# Altium footprint library PcbLib.PcbLib: 141 footprints (part 1 of 9)
Each footprint in its own frame and in the unit in brackets; x right, y up, seen from the top. Pads: shape width x height; smd on the part's side, far side on the other; paste and mask are expansions set on the pad; w line width, h text height; cw(c..) or ccw(c..) is an arc to the next point about the centre after c.
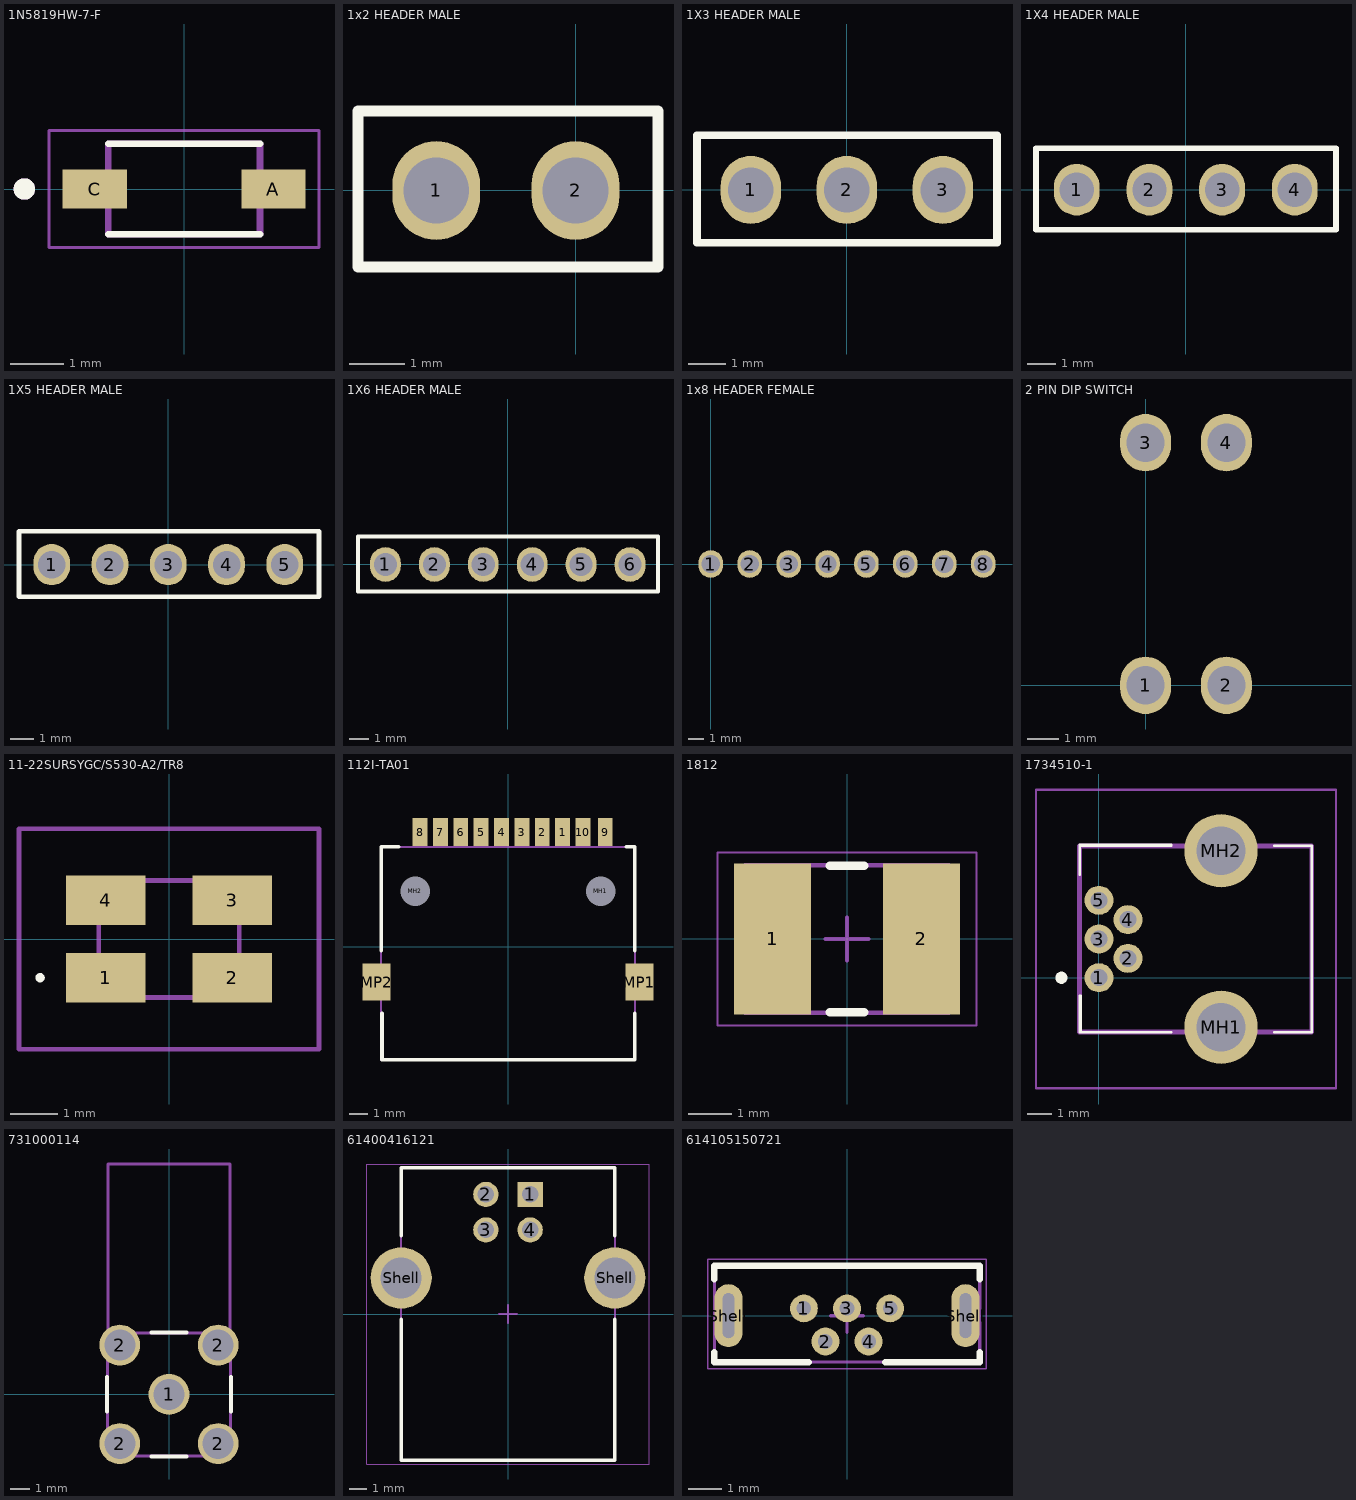
[diagram p0: the footprints below, top view; thin cyan lines are the x and y axes]

## 1N5819HW-7-F [mm]
pads (2):
  rect 1.21x0.73 smd: A(1.68,0) C(-1.68,0)
Top Overlay:
  circle w0.2: c-3,0 r0.1
  lines w0.127: -1.425,-0.85 1.425,-0.85 ; -1.425,0.85 1.425,0.85
Mechanical 13:
  circle w0.2: c-3,0 r0.1
  lines w0.127: -1.425,-0.85 1.425,-0.85 1.425,0.85 -1.425,0.85 -1.425,-0.85
Mechanical 15:
  lines w0.05: -2.535,-1.1 2.535,-1.1 2.535,1.1 -2.535,1.1 -2.535,-1.1
3D body "step_temp.STEP": height 1.5, standoff -0.03, extent -1.825,-0.775 1.825,0.775

## 1x2 HEADER MALE [mm]
pads (2):
  oval 1.6x1.8 hole 1.2: 1(-2.54,0) 2(0,0)
Top Overlay:
  lines w0.2: -3.965,-1.4 1.5,-1.4 1.5,1.45 -3.965,1.45 -3.965,-1.4
3D body "1x2THPitch 2_54mm.stp": height 9.2, standoff -3.5, extent -3.76,-1.27 1.32,1.27

## 1X3 HEADER MALE [mm]
pads (3):
  oval 1.6x1.8 hole 1.2: 1(-2.54,0) 2(0,0) 3(2.54,0)
Top Overlay:
  lines w0.2: -3.965,-1.4 -3.965,1.45 3.97,1.45 3.97,-1.4 -3.965,-1.4
3D body "1x3THPitch 2_54mm.STEP": height 9.2, standoff -3.5, extent -3.81,-1.27 3.81,1.27

## 1X4 HEADER MALE [mm]
pads (4):
  oval 1.6x1.8 hole 1.2: 1(-3.81,0) 2(-1.27,0) 3(1.27,0) 4(3.81,0)
Top Overlay:
  lines w0.2: -5.235,-1.4 -5.235,1.45 5.25,1.45 5.25,-1.4 -5.235,-1.4
3D body "1x4THPitch 2_54mm.STEP": height 9.2, standoff -3.5, extent -5.08,-1.27 5.08,1.27

## 1X5 HEADER MALE [mm]
pads (5):
  oval 1.6x1.8 hole 1.2: 1(-5.08,0) 2(-2.54,0) 3(0,0) 4(2.54,0) 5(5.08,0)
Top Overlay:
  lines w0.2: -6.505,-1.4 6.57,-1.4 6.57,1.45 -6.505,1.45 -6.505,-1.4
3D body "1x5THPitch 2_54mm.stp": height 9.2, standoff -3.5, extent -6.32,-1.27 6.38,1.27

## 1X6 HEADER MALE [mm]
pads (6):
  oval 1.6x1.8 hole 1.2: 1(-6.35,0) 2(-3.81,0) 3(-1.27,0) 4(1.27,0) 5(3.81,0) 6(6.35,0)
Top Overlay:
  lines w0.2: -7.775,-1.4 7.8,-1.4 7.8,1.45 -7.775,1.45 -7.775,-1.4
3D body "1x6THPitch 2_54mm.STEP": height 9.2, standoff -3.5, extent -7.62,-1.27 7.62,1.27

## 1x8 HEADER FEMALE [mm]
pads (8):
  oval 1.6x1.8 hole 1.2: 1(0,0) 2(2.54,0) 3(5.08,0) 4(7.62,0) 5(10.16,0) 6(12.7,0) 7(15.24,0) 8(17.78,0)
3D body "1X8Female.step": height 8.5, standoff -3.2, extent -1.46,-1.27 19.36,1.27

## 2 PIN DIP SWITCH [mm]
pads (4):
  oval 1.6x1.8 hole 1.2: 1(0,0) 2(2.54,0) 3(0,7.62) 4(2.54,7.62)
3D body "DIP Red 2-way.step": height 6.7, standoff -2, extent -1.92,-1.15 4.52,8.75

## 2S 18650 Battery Pack [mm]
3D body "2S 18650 Battery.stp": height 19.54, standoff 0, extent -37.9,-20.8 38.1,20.2

## 11-22SURSYGC/S530-A2/TR8 [mm]
pads (4):
  rect 1.7x1.05 smd: 1(-1.35,-0.825) 2(1.35,-0.825) 3(1.35,0.825) 4(-1.35,0.825)
Top Overlay:
  lines w0.1: -2.8,-0.825 ccw(c-2.75,-0.825) -2.7,-0.825 ccw(c-2.75,-0.825) -2.8,-0.825
Mechanical 15:
  lines w0.1: -1.5,-1.25 1.5,-1.25 1.5,1.25 -1.5,1.25 -1.5,-1.25
Mechanical 20:
  lines w0.1: -3.2,-2.35 3.2,-2.35 3.2,2.35 -3.2,2.35 -3.2,-2.35
3D body "11-22SURSYGC_S530-A2_TR8.stp": height 1.8, standoff 0, extent -1.5,-1.25 1.5,1.25

## 112I-TA01 [mm]
pads (14):
  rect 0.8x1.5 smd: 1(2.95,6.2) 2(1.85,6.2) 3(0.75,6.2) 4(-0.35,6.2) 5(-1.45,6.2) 6(-2.55,6.2) 7(-3.65,6.2) 8(-4.75,6.2) 9(5.25,6.2) 10(4.05,6.2)
  round 0.8 hole 1.6 unplated: MH1(5,3) MH2(-5,3)
  rect 1.5x2 smd: MP1(7.1,-1.9) MP2(-7.1,-1.9)
Top Overlay:
  lines w0.2: -6.85,-0.2 -6.85,5.4 -5.9,5.4 ; -6.8,-3.6 -6.8,-6.1 6.85,-6.1 6.85,-3.6 ; 6.4,5.4 6.85,5.4 6.85,-0.2
Mechanical 15:
  lines w0.1: -6.85,-6.1 -6.85,5.4 6.85,5.4 6.85,-6.1 -6.85,-6.1
3D body "112I-TA01_C_3.stp": height 2.01, standoff -0.49, extent -7.45,-5.997 7.55,6.603

## 1812 [mm]
height 0.45
pads (2):
  rect 1.78x3.5 smd: 1(-1.725,0) 2(1.725,0)
Top Overlay:
  lines w0.2: -0.4,-1.7 0.4,-1.7 ; -0.4,1.7 0.4,1.7
Top Courtyard:
  lines w0.05: -3,-2 3,-2 3,2 -3,2 -3,-2
  lines w0.1: -0.5,0 0.5,0 ; 0,-0.5 0,0.5
Top Assembly:
  lines w0.1: -2.365,-1.705 2.365,-1.705 2.365,1.705 -2.365,1.705 -2.365,-1.705
3D body "0ZCG0075FF2C.STEP": height 0.7, standoff 0, extent -2.264,-1.622 2.286,1.618

## 1734510-1 [mm]
pads (7):
  round 1.2 hole 0.7: 1(0,0) 2(1.2,0.8) 3(0,1.6) 4(1.2,2.4) 5(0,3.2)
  round 3.03 hole 2.02: MH1(5.05,-2.05) MH2(5.05,5.25)
Top Overlay:
  lines w0.1: -0.8,-2.25 3,-2.25 -0.8,-2.25 ; -0.8,-2.25 -0.8,-0.75 -0.75,-0.75 -0.75,-2.25 -0.8,-2.25 ; -0.8,5.45 -0.8,5.5 3,5.5 3,5.45 -0.8,5.45 ; -0.8,5.45 -0.8,4.25 -0.8,5.45 ; 8.8,5.45 8.8,-2.25 8.8,5.45 ; 8.8,5.45 7.25,5.45 8.8,5.45 ; 7.25,-2.25 8.75,-2.25 7.25,-2.25
  lines w0.4: -1.6,0 ccw(c-1.55,0) -1.5,0 ; -1.6,0 cw(c-1.55,0) -1.5,0 ; -1.6,0 ccw(c-1.55,0) -1.5,0
Mechanical 15:
  lines w0.2: -0.8,-2.25 -0.8,5.45 8.8,5.45 8.8,-2.25 -0.8,-2.25
Mechanical 20:
  lines w0.1: -2.6,-4.565 -2.6,7.765 9.8,7.765 9.8,-4.565 -2.6,-4.565
3D body "1734510-1.stp": height 4.1, standoff -2.84, extent -0.9,-2.7 8.7,6

## 731000114 [mil]
pads (5):
  round 83 hole 63: 1(0,0) 2(-100,-100) 2(-100,100) 2(100,-100) 2(100,100)
Top Overlay:
  lines w7.87: -125.98,-35.43 -125.98,35.43 ; -35.43,-125.98 35.43,-125.98 ; -35.43,125.98 35.43,125.98 ; 125.98,-35.43 125.98,35.43
Mechanical 13:
  lines w6: -125,-125 -125,125 125,125 125,-125 -125,-125 ; -124,125 -124,468 124,468 124,125 -124,125
3D body "0731000114.stp": height 377.27, standoff -154.22, extent -125,-125 125,457.68

## 61400416121 [mm]
pads (6):
  rect 1.42x1.42 hole 0.92: 1(1.25,6.74)
  round 1.42 hole 0.92: 2(-1.25,6.74) 3(-1.25,4.74) 4(1.25,4.74)
  round 3.45 hole 2.3: Shell(-6.02,2.03) Shell(6.02,2.03)
Top Overlay:
  lines w0.2: -6.02,-0.3 -6.02,-8.25 6.02,-8.25 6.02,-0.3 ; -6.02,4.4 -6.02,8.25 6.02,8.25 6.02,4.4
Top 3D Body:
  lines w0.1: -6.02,-8.25 -6.02,8.25 6.02,8.25 6.02,-8.25 -6.02,-8.25
Top Designator:
  text ".Designator" at -3.647,-0.357 h1
V Cut:
  lines w0.05: -7.945,-8.45 7.945,-8.45 7.945,8.45 -7.945,8.45 -7.945,-8.45
Top Assembly:
  lines w0.1: -6.02,-8.25 -6.02,8.25 6.02,8.25 6.02,-8.25 -6.02,-8.25
Top Component Center:
  lines w0.1: -0.5,0 0.5,0 ; 0,-0.5 0,0.5
3D body "61400416121.stp": height 11.15, standoff -3.71, extent -7.484,-8.25 7.484,8.25

## 614105150721 [mm]
pads (7):
  round 0.84 hole 0.44: 1(-1.3,0.22) 2(-0.65,-0.78) 3(0,0.22) 4(0.65,-0.78) 5(1.3,0.22)
  oval 0.85x1.9 hole 0.35 slot 1.35 at 90 deg: Shell(-3.575,0) Shell(3.575,0)
Top Overlay:
  lines w0.2: -4,-1.1 -4,-1.4 -1.15,-1.4 ; -4,1.1 -4,1.5 4,1.5 4,1.1 ; 1.15,-1.4 4,-1.4 4,-1.1
Top 3D Body:
  lines w0.1: -4,-1.4 -4,1.5 4,1.5 4,-1.4 -4,-1.4
Top Designator:
  text ".Designator" at -3.647,-0.357 h1
V Cut:
  lines w0.05: -4.2,-1.6 -4.2,1.7 4.2,1.7 4.2,-1.6 -4.2,-1.6
Top Assembly:
  lines w0.1: -4,-1.4 -4,1.5 4,1.5 4,-1.4 -4,-1.4
Top Component Center:
  lines w0.1: -0.5,0 0.5,0 ; 0,-0.5 0,0.5
3D body "Download_STP_614105150721_rev1.stp": height 5.64, standoff -1.51, extent -4,-1.4 4,1.5